# Altium footprint library PBL - THD Packages.PcbLib: 256 footprints (part 1 of 16)
Each footprint in its own frame and in the unit in brackets; x right, y up, seen from the top. Pads: shape width x height; smd on the part's side, far side on the other; paste and mask are expansions set on the pad; w line width, h text height; cw(c..) or ccw(c..) is an arc to the next point about the centre after c.
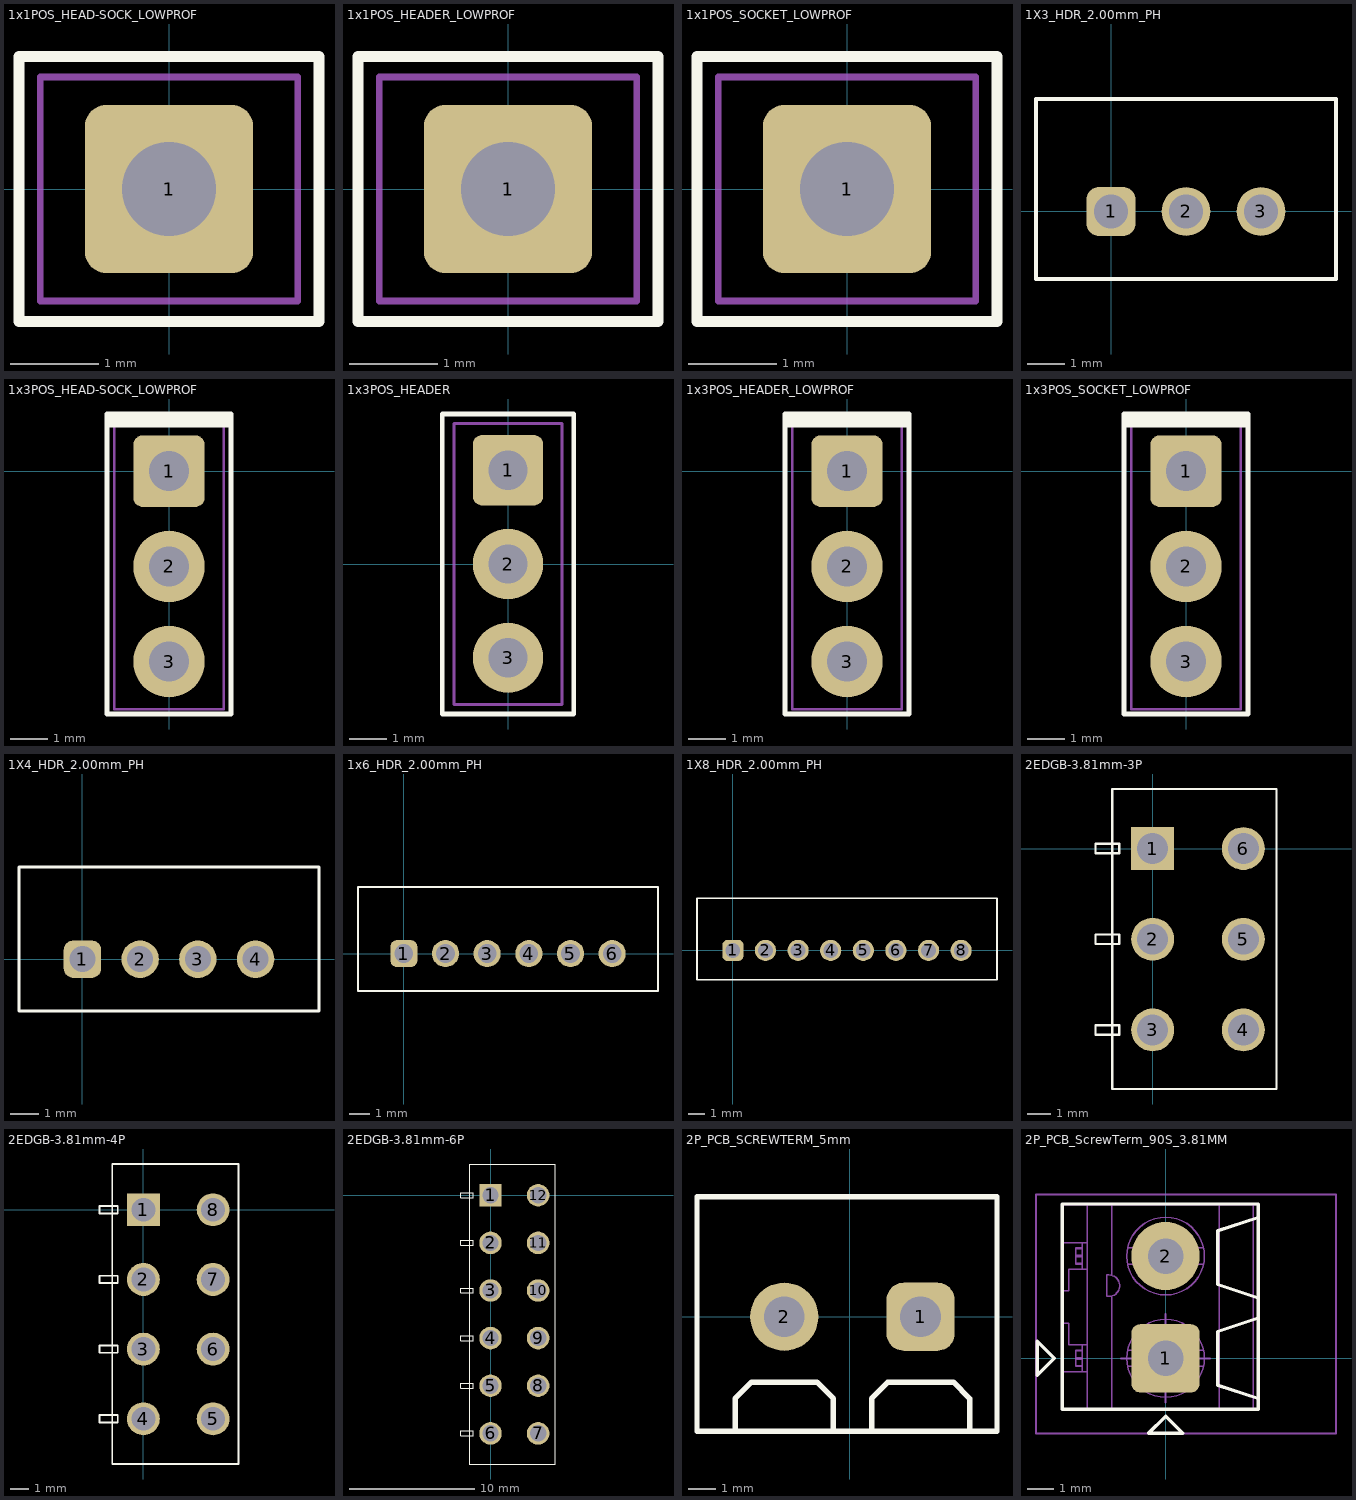
[diagram p0: the footprints below, top view; thin cyan lines are the x and y axes]

## 1x1POS_HEAD-SOCK_LOWPROF [mil] "Connector Socket with header, Single-row 1-position, 0.100\" pitch"
height 290
pads (1):
  rrect25% 75x75 hole 42: 1(0,0)
Top Overlay:
  lines w5: -66.93,-59.05 66.93,-59.05 66.93,59.06 -66.93,59.06 -66.93,-59.05
13 - 3D Top Side:
  lines w3: -57.47,-49.99 57.49,-49.99 57.49,50.01 -57.47,50.01 -57.47,-49.99
3D body "PinHeaderMating 1S.stp": height 165, standoff -125, extent -57.47,-50 57.49,50
3D body "PinHeaderMating 1P.stp": height 408, standoff 23, extent -57.47,-50 57.49,50

## 1x1POS_HEADER_LOWPROF [mil] "Connector Header, Single-row 1-position, 0.100\" pitch"
height 267
pads (1):
  rrect25% 75x75 hole 42: 1(0,0)
Top Overlay:
  lines w5: -66.93,-59.06 -66.93,59.06 66.93,59.06 66.93,-59.06 -66.93,-59.06
13 - 3D Top Side:
  lines w3: -57.47,-50 -57.47,50 57.49,50 57.49,-50 -57.47,-50
3D body "PinHeaderMating 1P.stp": height 267, standoff -118, extent -57.47,-50 57.49,50

## 1x1POS_SOCKET_LOWPROF [mil] "Connector Socket, Single-row 1-position, 0.100\" pitch"
height 165
pads (1):
  rrect25% 75x75 hole 42: 1(0,0)
Top Overlay:
  lines w5: -66.93,-59.06 66.93,-59.06 66.93,59.06 -66.93,59.06 -66.93,-59.06
13 - 3D Top Side:
  lines w3: -57.47,-50 57.49,-50 57.49,50 -57.47,50 -57.47,-50
3D body "PinHeaderMating 1S.stp": height 165, standoff -125, extent -57.47,-50 57.49,50

## 1X3_HDR_2.00mm_PH [mm]
pads (3):
  rrect50% 1.3x1.3 hole 0.9: 1(0,0)
  round 1.3 hole 0.9: 2(2,0) 3(4,0)
Top Overlay:
  lines w0.1: -2,-1.8 6,-1.8 6,3 -2,3 -2,-1.8
3D body "JST - PH - Thru (V) - 3Pin - 2.00mm.stp": height 5.89, standoff -3.05, extent -1.93,-1.7 5.93,2.974

## 1x3POS_HEAD-SOCK_LOWPROF [mil] "Connector Socket with header, Single-row 3-position, 0.100\" pitch"
height 290
pads (3):
  rrect25% 75x75 hole 42: 1(0,0)
  round 75 hole 42: 2(0,-100) 3(0,-200)
Top Overlay:
  lines w5: -65,48.19 65,48.19 ; -65,52.13 65,52.13 ; -65,56.06 65,56.06 ; -65,-255 -65,60 65,60 65,-255 -65,-255
13 - 3D Top Side:
  lines w3: -57.47,-250 -57.47,50 57.49,50 57.49,-250 -57.47,-250
3D body "PinHeaderMating 1S.stp": height 165, standoff -125, extent -57.47,-50 57.49,50
3D body "PinHeaderMating 1S.stp": height 165, standoff -125, extent -57.47,-150 57.49,-50
3D body "PinHeaderMating 1S.stp": height 165, standoff -125, extent -57.47,-250 57.49,-150
3D body "PinHeaderMating 1P.stp": height 408, standoff 23, extent -57.48,-50 57.49,50
3D body "PinHeaderMating 1P.stp": height 408, standoff 23, extent -57.48,-150 57.49,-50
3D body "PinHeaderMating 1P.stp": height 408, standoff 23, extent -57.48,-250 57.49,-150

## 1x3POS_HEADER [mil] "Connector Header, Single-row 3-position, 0.100\" pitch"
height 235
pads (3):
  rrect25% 75x75 hole 42: 1(0,100)
  round 75 hole 42: 2(0,0) 3(0,-100)
Top Overlay:
  lines w5: -70,-160 -70,160 70,160 70,-160 -70,-160
13 - 3D Top Side:
  lines w3: -57.47,-150 -57.47,150 57.49,150 57.49,-150 -57.47,-150
3D body "PinHeaderX3.stp": height 335.04, standoff -144.88, extent -57.47,-150 57.49,150

## 1x3POS_HEADER_LOWPROF [mil] "Connector Header, Single-row 3-position, 0.100\" pitch"
height 267
pads (3):
  rrect25% 75x75 hole 42: 1(0,0)
  round 75 hole 42: 2(0,-100) 3(0,-200)
Top Overlay:
  lines w5: -65,48.19 65,48.19 ; -65,52.13 65,52.13 ; -65,56.06 65,56.06 ; -65,-255 -65,60 65,60 65,-255 -65,-255
13 - 3D Top Side:
  lines w3: -57.47,-250 -57.47,50 57.49,50 57.49,-250 -57.47,-250
3D body "PinHeaderMating 1P.stp": height 267, standoff -118, extent -57.47,-50 57.49,50
3D body "PinHeaderMating 1P.stp": height 267, standoff -118, extent -57.47,-150 57.49,-50
3D body "PinHeaderMating 1P.stp": height 267, standoff -118, extent -57.47,-250 57.49,-150

## 1x3POS_SOCKET_LOWPROF [mil] "Connector Socket, Single-row 3-position, 0.100\" pitch"
height 165
pads (3):
  rrect25% 75x75 hole 42: 1(0,0)
  round 75 hole 42: 2(0,-100) 3(0,-200)
Top Overlay:
  lines w5: -65,48.19 65,48.19 ; -65,52.13 65,52.13 ; -65,56.06 65,56.06 ; -65,-255 -65,60 65,60 65,-255 -65,-255
13 - 3D Top Side:
  lines w3: -57.47,-250 -57.47,50 57.49,50 57.49,-250 -57.47,-250
3D body "PinHeaderMating 1S.stp": height 165, standoff -125, extent -57.47,-50 57.49,50
3D body "PinHeaderMating 1S.stp": height 165, standoff -125, extent -57.47,-150 57.49,-50
3D body "PinHeaderMating 1S.stp": height 165, standoff -125, extent -57.47,-250 57.49,-150

## 1X4_HDR_2.00mm_PH [mm]
pads (4):
  rrect50% 1.3x1.3 hole 0.9: 1(0,0)
  round 1.3 hole 0.9: 2(2,0) 3(4,0) 4(6,0)
Top Overlay:
  lines w0.1: -2.2,-1.8 8.2,-1.8 8.2,3.2 -2.2,3.2 -2.2,-1.8
3D body "JST - PH - Thru (V) - 4Pin - 2.00mm.stp": height 5.89, standoff -3.05, extent -1.93,-1.7 7.93,2.974

## 1x6_HDR_2.00mm_PH [mm]
pads (6):
  rrect50% 1.3x1.3 hole 0.9: 1(0,0)
  round 1.3 hole 0.9: 2(2,0) 3(4,0) 4(6,0) 5(8,0) 6(10,0)
Top Overlay:
  lines w0.1: -2.2,-1.8 -2.2,3.2 12.2,3.2 12.2,-1.8 -2.2,-1.8
3D body "JST - PH - Thru (V) - 6Pin - 2.00mm.stp": height 5.89, standoff -3.05, extent -1.93,-1.7 11.93,2.974

## 1X8_HDR_2.00mm_PH [mm]
pads (8):
  rrect50% 1.3x1.3 hole 0.9: 1(0,0)
  round 1.3 hole 0.9: 2(2,0) 3(4,0) 4(6,0) 5(8,0) 6(10,0) 7(12,0) 8(14,0)
Top Overlay:
  lines w0.1: -2.2,-1.8 16.2,-1.8 16.2,3.2 -2.2,3.2 -2.2,-1.8
3D body "JST - PH - Thru (V) - 8Pin - 2.00mm.stp": height 5.89, standoff -3.05, extent -1.93,-1.674 15.93,3

## 2EDGB-3.81mm-3P [mm]
pads (6):
  rect 1.8x1.8 hole 1.3: 1(0,0)
  round 1.8 hole 1.3: 2(0,-3.81) 3(0,-7.62) 4(3.81,-7.62) 5(3.81,-3.81) 6(3.81,0)
Top Overlay:
  lines w0.1: -2.4,-7.82 -1.4,-7.82 -1.4,-7.42 -2.4,-7.42 -2.4,-7.82 ; -2.4,-4.01 -1.4,-4.01 -1.4,-3.61 -2.4,-3.61 -2.4,-4.01 ; -2.4,-0.2 -1.4,-0.2 -1.4,0.2 -2.4,0.2 -2.4,-0.2 ; -1.7,-10.1 5.2,-10.1 5.2,2.5 -1.7,2.5 -1.7,-10.1

## 2EDGB-3.81mm-4P [mm]
pads (8):
  rect 1.8x1.8 hole 1.3: 1(0,0)
  round 1.8 hole 1.3: 2(0,-3.81) 3(0,-7.62) 4(0,-11.43) 5(3.81,-11.43) 6(3.81,-7.62) 7(3.81,-3.81) 8(3.81,0)
Top Overlay:
  lines w0.1: -2.4,-11.63 -1.4,-11.63 -1.4,-11.23 -2.4,-11.23 -2.4,-11.63 ; -2.4,-7.82 -1.4,-7.82 -1.4,-7.42 -2.4,-7.42 -2.4,-7.82 ; -2.4,-4.01 -1.4,-4.01 -1.4,-3.61 -2.4,-3.61 -2.4,-4.01 ; -2.4,-0.2 -1.4,-0.2 -1.4,0.2 -2.4,0.2 -2.4,-0.2 ; -1.7,-13.9 5.2,-13.9 5.2,2.5 -1.7,2.5 -1.7,-13.9

## 2EDGB-3.81mm-6P [mm]
pads (12):
  rect 1.8x1.8 hole 1.3: 1(0,0)
  round 1.8 hole 1.3: 2(0,-3.81) 3(0,-7.62) 4(0,-11.43) 5(0,-15.24) 6(0,-19.05) 7(3.81,-19.05) 8(3.81,-15.24) 9(3.81,-11.43) 10(3.81,-7.62) 11(3.81,-3.81) 12(3.81,0)
Top Overlay:
  lines w0.1: -2.4,-19.25 -1.4,-19.25 -1.4,-18.85 -2.4,-18.85 -2.4,-19.25 ; -2.4,-15.44 -1.4,-15.44 -1.4,-15.04 -2.4,-15.04 -2.4,-15.44 ; -2.4,-11.63 -1.4,-11.63 -1.4,-11.23 -2.4,-11.23 -2.4,-11.63 ; -2.4,-7.82 -1.4,-7.82 -1.4,-7.42 -2.4,-7.42 -2.4,-7.82 ; -2.4,-4.01 -1.4,-4.01 -1.4,-3.61 -2.4,-3.61 -2.4,-4.01 ; -2.4,-0.2 -1.4,-0.2 -1.4,0.2 -2.4,0.2 -2.4,-0.2 ; -1.7,-21.5 5.2,-21.5 5.2,2.5 -1.7,2.5 -1.7,-21.5

## 2P_PCB_SCREWTERM_5mm [mm]
pads (2):
  rrect50% 2.5x2.5 hole 1.5: 1(2.6,0)
  round 2.5 hole 1.5: 2(-2.4,0)
Top Overlay:
  lines w0.2: -4.2,-4.2 -4.2,-3 -3.6,-2.4 ; -0.6,-4.2 -0.6,-3 -1.2,-2.4 ; 0.8,-4.2 0.8,-3 1.4,-2.4 3.8,-2.4 4.4,-3 4.4,-4.2 ; -3.6,-2.4 -3.6,-2.4 ; -3.6,-2.4 -1.2,-2.4 ; -1.2,-2.4 -1.2,-2.4 ; -5.6,-4.2 -5.6,4.4 5.4,4.4 5.4,-4.2 -5,-4.2 -5.6,-4.2
3D body "termblock.stp": height 10, standoff -3.5, extent -5.4,-4 5.2,4.2

## 2P_PCB_ScrewTerm_90S_3.81MM [mil] "TERM BLOCK 2POS SIDE ENT STACKABLE 3.81MM"
height 334.65
pads (2):
  rrect25% 100x100 hole 52: 1(0,0)
  round 100 hole 52: 2(0,150)
Top Overlay:
  lines w5: 135.83,-59.06 76.78,-39.37 76.78,39.37 135.83,59.06 ; 135.83,88.58 76.78,108.27 76.78,187.01 135.83,206.69 ; -188,-25 -188,25 -163,0 -188,-25 ; -151.57,-75 135.83,-75 135.83,226.38 -151.57,226.38 -151.57,-75 ; -25,-110 0,-85 25,-110 -25,-110
13 - 3D Top Side:
  circle w1.97: c0,150 r57.09
  circle w1.97: c0,0 r57.09
  lines w1.97: -151.57,-19.69 -114.76,-19.69 -114.76,19.68 -141.73,19.68 -141.73,51.18 -151.57,51.18 ; -151.57,98.82 -141.73,98.82 -141.73,130.31 -114.76,130.31 -114.76,169.69 -151.57,169.69 ; -131.89,-10.91 -122.05,-10.91 ; -131.89,-1.06 -122.05,-1.06 ; -131.89,1.06 -122.05,1.06 ; -131.89,10.91 -122.05,10.91 ; -131.89,139.09 -122.05,139.09 ; -131.89,148.94 -122.05,148.94 ; -131.89,151.06 -122.05,151.06 ; -131.89,160.91 -122.05,160.91 ; -122.05,-19.69 -122.05,19.68 ; -122.05,-11.81 -131.89,-11.81 -131.89,11.81 -122.05,11.81 ; -122.05,130.31 -122.05,169.69 ; -122.05,138.19 -131.89,138.19 -131.89,161.81 -122.05,161.81 ; -114.56,-75 -114.56,225 ; -78.74,-75 -78.74,91.34 ; -78.74,121.65 -78.74,225 ; -55.85,-11.81 55.85,-11.81 ; -55.85,11.81 55.85,11.81 ; -55.85,138.19 55.85,138.19 ; -55.85,161.81 55.85,161.81 ; 78.74,-75 78.74,225 ; 128.89,-75 128.89,225 ; -151.57,-75 135.83,-75 135.83,225 -151.57,225 -151.57,-75 ; -85.91,90.75 -85.91,122.24 -83.03,122.24 cw(c-83.03,106.5) -83.03,90.75 -85.91,90.75
15 - Top Courtyards:
  lines w3: -65,0 65,0 ; 0,-65 0,65 ; -190,-110 250,-110 250,240 -190,240 -190,-110
3D body "c-1776113-2-o-3d.stp": height 334.65, standoff -137.8, extent -151.57,-75.19 135.83,224.81